# Altium footprint library asib.PcbLib: 45 footprints (part 1 of 3)
Each footprint in its own frame and in the unit in brackets; x right, y up, seen from the top. Pads: shape width x height; smd on the part's side, far side on the other; paste and mask are expansions set on the pad; w line width, h text height; cw(c..) or ccw(c..) is an arc to the next point about the centre after c.
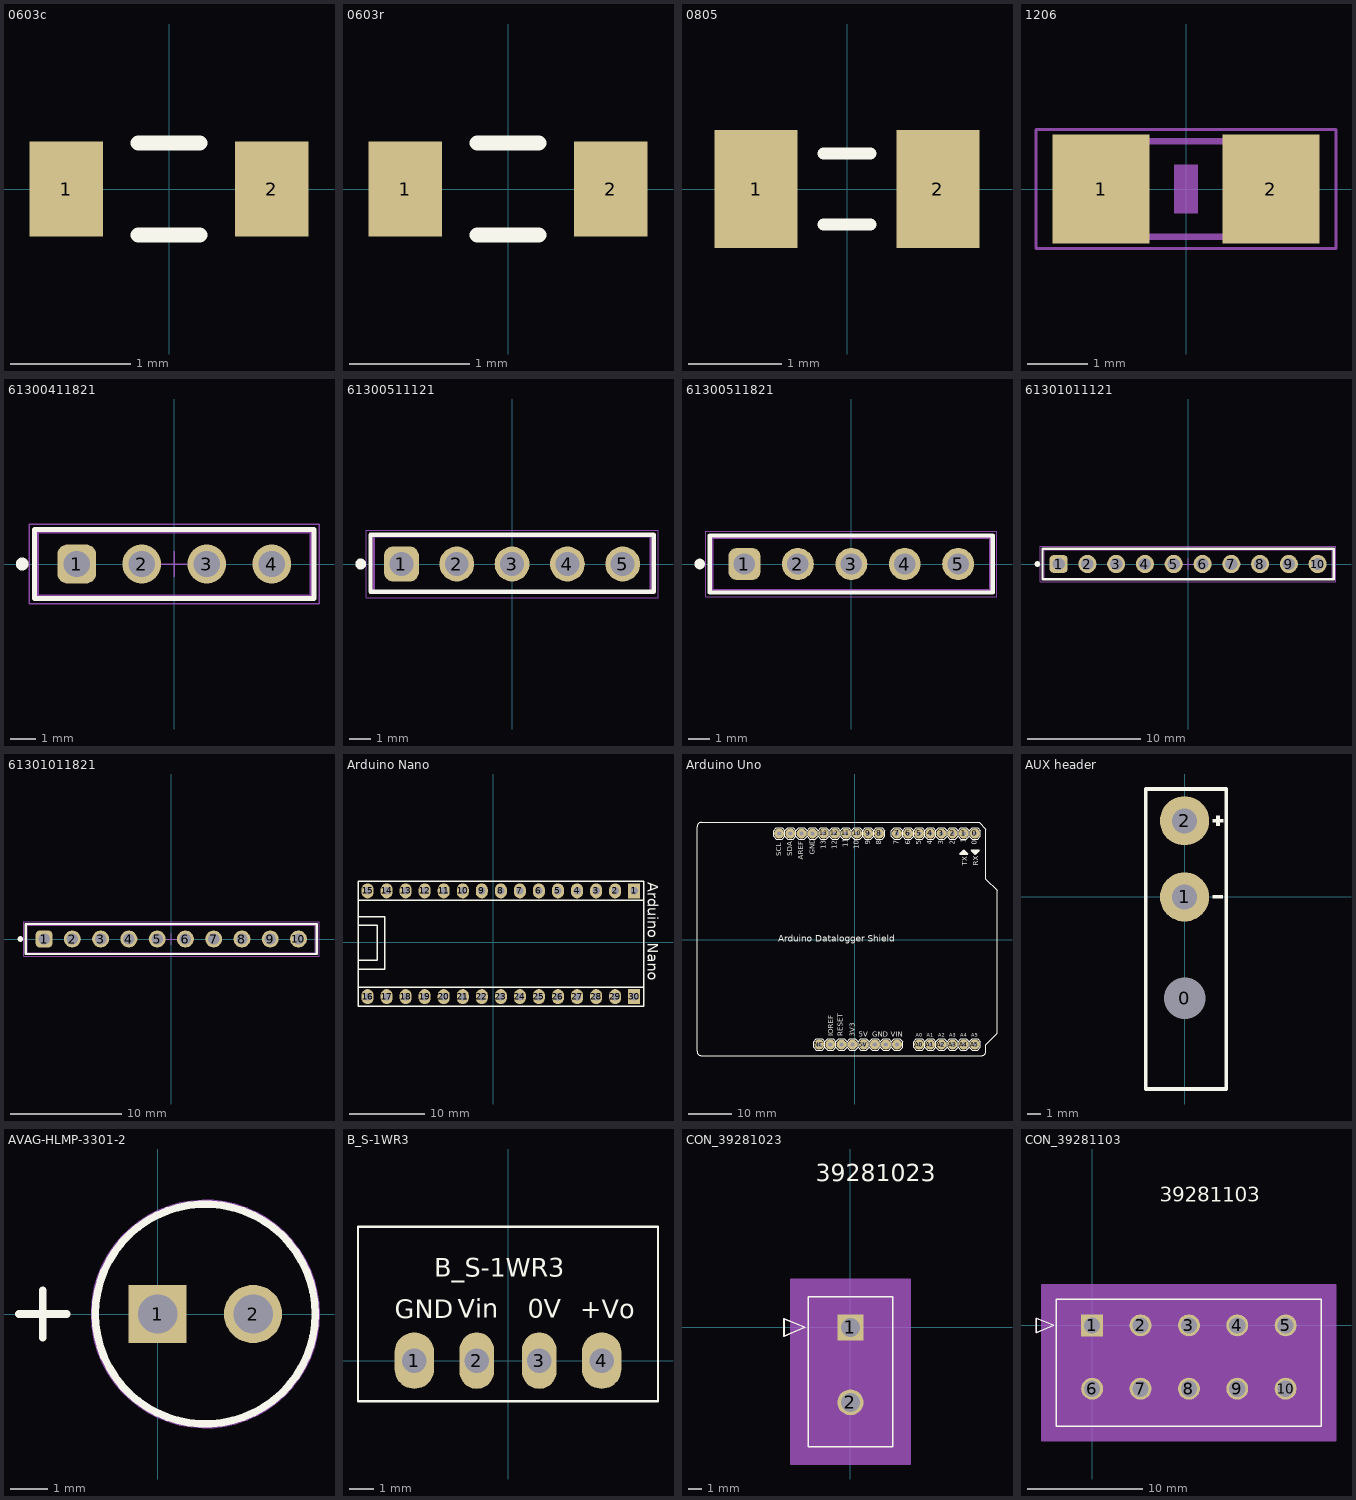
[diagram p0: the footprints below, top view; thin cyan lines are the x and y axes]

## 0603c [mil]
pads (2):
  rect 24x31 smd: 1(-33.5,0) 2(33.5,0)
Top Overlay:
  lines w5: -10,-15 10,-15 ; -10,15 10,15
3D body "User Library-C0603-2.step": height 31.5, standoff 0, extent -31.5,-15.5 31.5,16

## 0603r [mil]
pads (2):
  rect 24x31 smd: 1(-33.5,0) 2(33.5,0)
Top Overlay:
  lines w5: -10,-15 10,-15 ; -10,15 10,15
3D body "User Library-RES_1609-0603.step": height 22.05, standoff 0, extent -33.46,-15.74 33.47,15.75

## 0805 [mil]
pads (2):
  rect 35x50 smd: 1(-38.5,0) 2(38.5,0)
Top Overlay:
  lines w5: -10,-15 10,-15 ; -10,15 10,15
Mechanical 6:
  text ".Designator" at -65,-25 h19.68
3D body "CircuitWorks-RC0805.step": height 23.62, standoff 0, extent -38.37,-24.6 40.37,24.61

## 1206 [mm]
pads (2):
  rect 1.6x1.8 smd: 1(-1.4,0) 2(1.4,0)
Mechanical 6:
  rectangle: -0.2,-0.4 0.2,0.4
Top Component Center:
  rectangle: 0.952,-0.849 1.702,0.851
  rectangle: -1.702,-0.851 -0.952,0.849
  lines w0.051: -2.473,-0.983 -2.473,0.983 2.473,0.983 2.473,-0.983 -2.473,-0.983
  lines w0.102: -0.965,-0.787 0.965,-0.787 ; -0.965,0.787 0.965,0.787
3D body "User Library-1206 SMD Capacitor.step": height 1, standoff 0, extent -1.6,-0.8 1.6,0.8

## 61300411821 [mm] "Socket Header, Pitch 2.54 mm, THT, Vertical, single row, 4p"
height 8.5
pads (4):
  rrect50% 1.52x1.52 hole 1.02: 1(-3.81,0)
  round 1.52 hole 1.02: 2(-1.27,0) 3(1.27,0) 4(3.81,0)
Top Overlay:
  circle w0.25: c-5.94,0 r0.125
  lines w0.2: -5.455,-1.35 -5.455,1.35 5.455,1.35 5.455,-1.35 -5.455,-1.35
Top Designator:
  text ".Designator" at -7.498,-0.5 h1.5
Top Component Outline:
  lines w0.1: -5.33,-1.25 -5.33,1.25 5.33,1.25 5.33,-1.25 -5.33,-1.25
Top Courtyard:
  lines w0.05: -5.655,-1.55 -5.655,1.55 5.655,1.55 5.655,-1.55 -5.655,-1.55
Top Component Center:
  lines w0.05: -0.5,0 0.5,0 ; 0,-0.5 0,0.5
3D body "61300411821.stp": height 8.55, standoff -3.05, extent -5.33,-1.25 5.33,1.25

## 61300511121 [mm] "Pin Header, pitch 2.54 mm, THT, Vertical, single row, 5p"
height 8.54
pads (5):
  rrect50% 1.6x1.6 hole 1.1: 1(-5.08,0)
  round 1.6 hole 1.1: 2(-2.54,0) 3(0,0) 4(2.54,0) 5(5.08,0)
Top Overlay:
  circle w0.25: c-6.95,0 r0.125
  lines w0.2: -6.5,-1.27 -6.5,1.345 6.5,1.345 6.5,-1.27 -6.5,-1.27
Top Designator:
  text ".Designator" at -7.498,-0.5 h1.5
Top Component Outline:
  lines w0.1: -6.35,-1.27 6.35,-1.27 6.35,1.27 -6.35,1.27 -6.35,-1.27
Top Courtyard:
  lines w0.05: -6.7,-1.545 -6.7,1.545 6.7,1.545 6.7,-1.545 -6.7,-1.545
Top Component Center:
  lines w0.05: -0.5,0 0.5,0 ; 0,-0.5 0,0.5
3D body "61300511121.stp": height 8.57, standoff -2.97, extent -6.35,-1.27 6.35,1.27

## 61300511821 [mm] "Socket Header, Pitch 2.54 mm, THT, Vertical, single row, 5p"
height 8.5
pads (5):
  rrect50% 1.52x1.52 hole 1.02: 1(-5.08,0)
  round 1.52 hole 1.02: 2(-2.54,0) 3(0,0) 4(2.54,0) 5(5.08,0)
Top Overlay:
  circle w0.25: c-7.21,0 r0.125
  lines w0.2: -6.725,-1.35 6.725,-1.35 6.725,1.35 -6.725,1.35 -6.725,-1.35
Top Designator:
  text ".Designator" at -7.498,-0.5 h1.5
Top Component Outline:
  lines w0.1: -6.6,-1.25 6.6,-1.25 6.6,1.25 -6.6,1.25 -6.6,-1.25
Top Courtyard:
  lines w0.05: -6.925,-1.55 6.925,-1.55 6.925,1.55 -6.925,1.55 -6.925,-1.55
Top Component Center:
  lines w0.05: -0.5,0 0.5,0 ; 0,-0.5 0,0.5
3D body "61300511821.stp": height 8.55, standoff -3.06, extent -6.6,-1.25 6.6,1.25

## 61301011121 [mm] "Pin Header, pitch 2.54 mm, THT, Vertical, single row, 10p"
height 8.54
pads (10):
  rrect50% 1.6x1.6 hole 1.1: 1(-11.43,0)
  round 1.6 hole 1.1: 2(-8.89,0) 3(-6.35,0) 4(-3.81,0) 5(-1.27,0) 6(1.27,0) 7(3.81,0) 8(6.35,0) 9(8.89,0) 10(11.43,0)
Top Overlay:
  circle w0.25: c-13.3,0 r0.125
  lines w0.2: -12.85,-1.345 -12.85,1.345 12.85,1.345 12.85,-1.345 -12.85,-1.345
Top Designator:
  text ".Designator" at -7.498,-0.5 h1.5
Top Component Outline:
  lines w0.1: -12.7,-1.27 12.7,-1.27 12.7,1.27 -12.7,1.27 -12.7,-1.27
Top Courtyard:
  lines w0.05: -13.05,-1.545 13.05,-1.545 13.05,1.545 -13.05,1.545 -13.05,-1.545
Top Component Center:
  lines w0.05: -0.5,0 0.5,0 ; 0,-0.5 0,0.5
3D body "61301011121.stp": height 8.57, standoff -2.97, extent -12.7,-1.27 12.7,1.27

## 61301011821 [mm] "Socket Header, Pitch 2.54 mm, THT, Vertical, single row, 10p"
height 8.5
pads (10):
  rrect50% 1.52x1.52 hole 1.02: 1(-11.43,0)
  round 1.52 hole 1.02: 2(-8.89,0) 3(-6.35,0) 4(-3.81,0) 5(-1.27,0) 6(1.27,0) 7(3.81,0) 8(6.35,0) 9(8.89,0) 10(11.43,0)
Top Overlay:
  circle w0.25: c-13.56,0 r0.125
  lines w0.2: -13.075,-1.35 -13.075,1.35 13.075,1.35 13.075,-1.35 -13.075,-1.35
Top Designator:
  text ".Designator" at -7.498,-0.5 h1.5
Top Component Outline:
  lines w0.1: -12.95,-1.25 -12.95,1.25 12.95,1.25 12.95,-1.25 -12.95,-1.25
Top Courtyard:
  lines w0.05: -13.275,-1.55 -13.275,1.55 13.275,1.55 13.275,-1.55 -13.275,-1.55
Top Component Center:
  lines w0.05: -0.5,0 0.5,0 ; 0,-0.5 0,0.5
3D body "61301011821.stp": height 8.55, standoff -3.06, extent -12.95,-1.25 12.95,1.25

## Arduino Nano [mm]
pads (30):
  rect 1.6x2 hole 1: 1(18.796,6.858) 30(18.796,-7.239)
  oval 1.6x2 hole 1: 2(16.256,6.858) 3(13.716,6.858) 4(11.176,6.858) 5(8.636,6.858) 6(6.096,6.858) 7(3.556,6.858) 8(1.016,6.858) 9(-1.524,6.858) 10(-4.064,6.858) 11(-6.604,6.858) 12(-9.144,6.858) 13(-11.684,6.858) 14(-14.224,6.858) 15(-16.764,6.858) 16(-16.764,-7.239) 17(-14.224,-7.239) 18(-11.684,-7.239) 19(-9.144,-7.239) 20(-6.604,-7.239) 21(-4.064,-7.239) 22(-1.524,-7.239) 23(1.016,-7.239) 24(3.556,-7.239) 25(6.096,-7.239) 26(8.636,-7.239) 27(11.176,-7.239) 28(13.716,-7.239) 29(16.256,-7.239)
Top Overlay:
  lines w0.2: -18.034,-7.493 -18.034,6.858 ; -18.034,-3.429 -18.034,-3.556 -14.478,-3.556 -14.478,3.429 -18.034,3.429 ; -18.034,-2.413 -15.494,-2.413 -15.494,2.286 -18.034,2.286 ; 20.066,-8.128 20.066,8.001 ; -18.034,-8.509 18.161,-8.509 20.066,-8.509 20.066,-5.969 -18.034,-5.969 -18.034,-8.509 ; -18.034,5.588 18.161,5.588 20.066,5.588 20.066,8.128 -18.034,8.128 -18.034,5.588
  text "Arduino Nano" at 20.574,8.001 h1.4

## Arduino Uno [mm]
pads (32):
  round 2.3 hole 1: 0(27.44,24.26) 1(24.9,24.26) 2(22.36,24.26) 3(19.82,24.26) 3.3V(-0.5,-24) 4(17.28,24.26) 5(14.74,24.26) 5V(2.04,-24) 6(12.2,24.26) 7(9.66,24.26) 8(5.596,24.26) 9(3.056,24.26) 10(0.516,24.26) 11(-2.024,24.26) 12(-4.564,24.26) 13(-7.104,24.26) A0(14.74,-24) A1(17.28,-24) A2(19.82,-24) A3(22.36,-24) A4(24.9,-24) A5(27.44,-24) AREF(-12.184,24.26) GND1(7.12,-24) GND2(4.58,-24) GND3(-9.644,24.26) IOREF(-5.58,-24) NC(-8.12,-24) RST(-3.04,-24) SCL(-17.264,24.26) SDA(-14.724,24.26) Vin(9.66,-24)
Top Overlay:
  drawing of 255 lines, arcs and shapes, not listed
  text "Arduino Datalogger Shield" at -17.5,-0.5 h1.52
  text "SDA" at -14.271,19.087 h1.21
  text "SCL" at -16.8,19.1 h1.21
  text "0" at 27.887,21.676 h1.21
  text "1" at 25.347,22.079 h1.21
  text "2" at 22.807,21.676 h1.21
  text "3" at 20.267,21.676 h1.21
  text "4" at 17.727,21.676 h1.21
  text "5" at 15.187,21.676 h1.21
  text "6" at 12.647,21.676 h1.21
  text "7" at 10.107,21.676 h1.21
  text "8" at 6.043,21.676 h1.21
  text "9" at 3.503,21.676 h1.21
  text "10" at 0.963,20.669 h1.21
  text "11" at -1.577,21.072 h1.21
  text "12" at -4.117,20.669 h1.21
  text "13" at -6.657,20.669 h1.21
  text "RX" at 28.202,16.894 h1.21
  text "TX" at 25.662,16.919 h1.21
  text "IOREF" at -4.945,-22.095 h1.21
  text "GND" at 3.97,-22.222 h1.21
  text "VIN" at 8.263,-22.222 h1.21
  text "A5" at 26.653,-22.197 h0.86
  text "A4" at 24.113,-22.197 h0.86
  text "A3" at 21.573,-22.197 h0.86
  text "A2" at 19.033,-22.197 h0.86
  text "A1" at 16.493,-22.197 h0.86
  text "3V3" at 0.008,-22.222 h1.21
  text "RESET" at -2.786,-22.095 h1.21
  text "GND" at -9.172,19.386 h1.21
  text "AREF" at -11.814,18.203 h1.21
  text "A0" at 13.953,-22.197 h0.86
  text "5V" at 0.897,-22.222 h1.21

## AUX header [mil]
pads (3):
  round 80 hole 118.11 unplated: 0(0,-287.4)
  round 140 hole 71: 1(0,0) 2(0,216.54)
Top Overlay:
  rectangle: 80,211.5 110,221.5
  rectangle: 90,201.5 100,231.5
  rectangle: 79.5,-5 109.5,5
  lines w10: -111,-546 118,-546 119,-545 119,307 -111,307 -111,-546
3D body "039300020 minifit 2 pos.stp": height 448.82, standoff -141.73, extent -110,-543.42 118.35,241.42

## AVAG-HLMP-3301-2 [mm] "THD, 2-Leads, Body Dia 5.85mm"
pads (2):
  rect 1.55x1.55 hole 1.05: 1(0,0)
  round 1.55 hole 1.05: 2(2.54,0)
Top Overlay:
  circle w0.2: c1.27,0 r2.923
  lines w0.2: -3.683,0 -2.413,0 ; -3.048,-0.635 -3.048,0.635
Top 3D Body:
  circle w0.1: c1.27,0 r2.923
Top Courtyard:
  circle w0.05: c1.27,0 r3.023

## B_S-1WR3 [mm] "Isolated DC-DC / 13.5 V - 16.5 V IN / 9 V OUT"
pads (4):
  oval 1.6x2.3 hole 1: 1(-3.81,0) 4(3.81,0)
  oval 1.4x2.3 hole 1: 2(-1.27,0) 3(1.27,0)
Top Overlay:
  lines w0.1: -6.1,-1.662 6.1,-1.662 6.1,5.45 -6.1,5.45 -6.1,-1.662
  text "GND" at -4.607,1.724 h0.76
  text "B_S-1WR3" at -3.006,3.418 h0.76
  text "Vin" at -2.034,1.731 h0.76
  text "+Vo" at 2.93,1.716 h0.76
  text "0V" at 0.808,1.734 h0.76
3D body "B-S-1WR3.stp": height 10.2, standoff -4.06, extent -5.814,-0.884 5.786,5.116

## CON_39281023 [mm]
pads (2):
  rect 1.9x1.9 / inner round 1.524 / far side rect 1.9x1.9 hole 1.4 paste-2539.97 mask+0.076: 1(0,0)
  round 1.9 / inner round 1.524 / far side round 1.9 hole 1.4 paste-2539.97 mask+0.076: 2(0,-5.5)
Top Overlay:
  lines w0.127: -4.878,-0.635 -3.354,0 -4.878,0.635 -4.878,-0.635 ; -3.1,-8.75 3.1,-8.75 3.1,2.25 -3.1,2.25 -3.1,-8.75
  text "39281023" at -2.54,10.72 h1.27
Top Designator:
  text "PTH_DRILL_SIZE:_1.4_MM,_TOL:_+0.05/-0.05" at -12.7,-17.22 h1.27
Mechanical 10:
  text "PTH_DRILL_SIZE:_1.4_MM,_TOL:_+0.05/-0.05" at -12.7,-17.22 h1.27
Top 3D Body:
  lines w0.127: -4.878,-0.635 -3.354,0 -4.878,0.635 -4.878,-0.635 ; -3.1,-8.75 -3.1,2.25 3.1,2.25 3.1,-8.75 -3.1,-8.75
  text "39281023" at -2.54,10.72 h1.27
Top Courtyard:
  region: 4.37,3.52 -4.37,3.52 -4.37,-10.02 4.37,-10.02
  lines w0.127: -4.37,-10.02 4.37,-10.02 4.37,3.52 -4.37,3.52 -4.37,-10.02

## CON_39281103 [mm]
pads (10):
  rect 1.9x1.9 / inner round 1.524 / far side rect 1.9x1.9 hole 1.4 paste-2539.97 mask+0.076: 1(0,0)
  round 1.9 / inner round 1.524 / far side round 1.9 hole 1.4 paste-2539.97 mask+0.076: 2(4.2,0) 3(8.4,0) 4(12.6,0) 5(16.8,0) 6(0,-5.5) 7(4.2,-5.5) 8(8.4,-5.5) 9(12.6,-5.5) 10(16.8,-5.5)
Top Overlay:
  lines w0.127: -4.878,-0.635 -3.354,0 -4.878,0.635 -4.878,-0.635 ; -3.1,-8.75 19.9,-8.75 19.9,2.25 -3.1,2.25 -3.1,-8.75
  text "39281103" at 5.86,10.72 h1.27
Top Designator:
  text "PTH_DRILL_SIZE:_1.4_MM,_TOL:_+0.05/-0.05" at -4.3,-17.22 h1.27
Mechanical 10:
  text "PTH_DRILL_SIZE:_1.4_MM,_TOL:_+0.05/-0.05" at -4.3,-17.22 h1.27
Top 3D Body:
  lines w0.127: -4.878,-0.635 -3.354,0 -4.878,0.635 -4.878,-0.635 ; -3.1,-8.75 -3.1,2.25 19.9,2.25 19.9,-8.75 -3.1,-8.75
  text "39281103" at 5.86,10.72 h1.27
Top Courtyard:
  region: 21.17,3.52 -4.37,3.52 -4.37,-10.02 21.17,-10.02
  lines w0.127: -4.37,-10.02 21.17,-10.02 21.17,3.52 -4.37,3.52 -4.37,-10.02